# Altium footprint library LDCN Components.PcbLib: 426 footprints (part 3 of 27)
Each footprint in its own frame and in the unit in brackets; x right, y up, seen from the top. Pads: shape width x height; smd on the part's side, far side on the other; paste and mask are expansions set on the pad; w line width, h text height; cw(c..) or ccw(c..) is an arc to the next point about the centre after c.
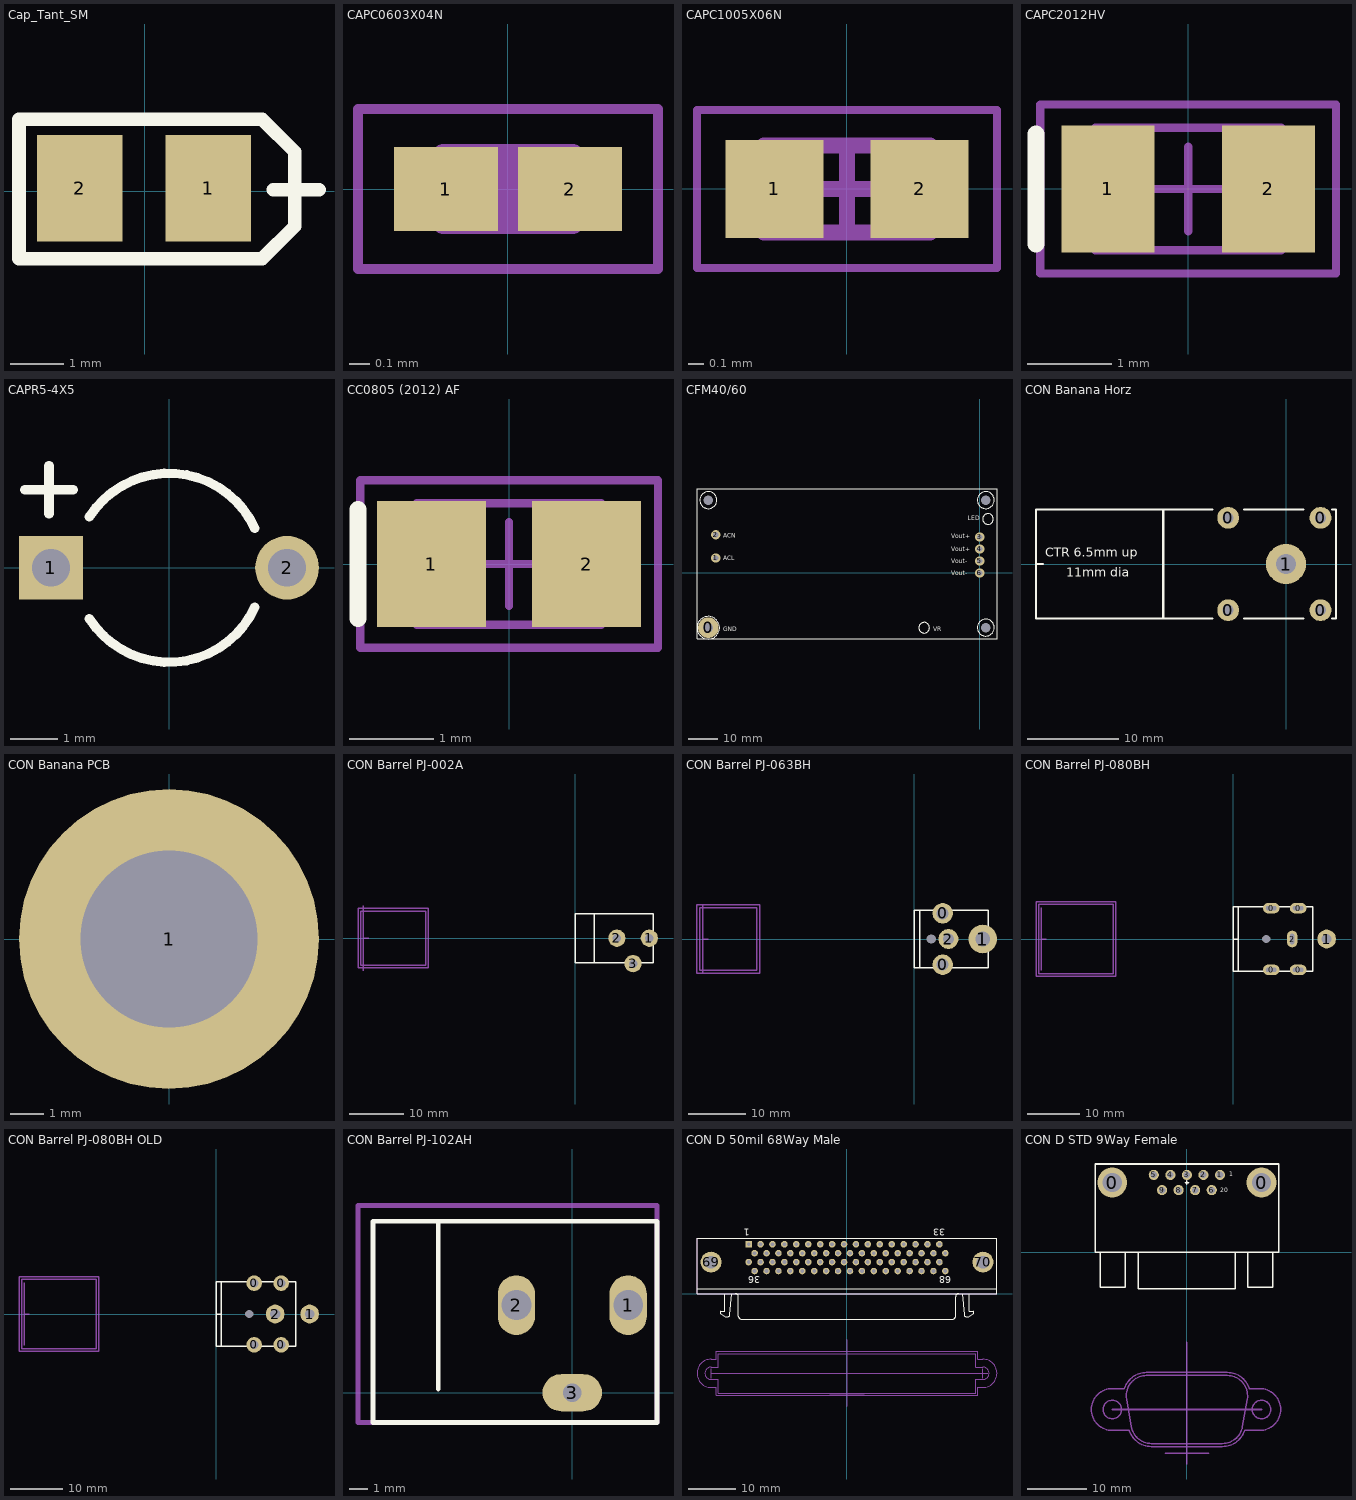
[diagram p2: the footprints below, top view; thin cyan lines are the x and y axes]

## Cap_Tant_SM [mm] "Tantalum Capacitor SM TAJA"
pads (2):
  rect 1.6x2 smd: 1(1.194,0.051) 2(-1.219,0.051)
Top Overlay:
  lines w0.254: 2.413,0.025 3.277,0.025 ; -2.362,-1.27 -2.362,1.346 2.21,1.346 2.819,0.737 2.819,-0.66 2.21,-1.27 -2.362,-1.27

## CAPC0603X04N [mm] "Chip Capacitor, 2-Leads, Body 0.60x0.30mm, IPC Medium Density"
height 0.35
pads (2):
  rect 0.52x0.42 smd: 1(-0.31,0) 2(0.31,0)
Mechanical 13:
  lines w0.1: -0.325,-0.175 -0.325,0.175 0.325,0.175 0.325,-0.175 -0.325,-0.175
Mechanical 15:
  lines w0.05: -0.75,-0.4 -0.75,0.4 0.75,0.4 0.75,-0.4 -0.75,-0.4
  lines w0.1: -0.175,0 0.175,0 ; 0,-0.175 0,0.175
3D body: height 0.35, standoff 0, extent -0.175,-0.175 0.175,0.175
3D body: height 0.35, standoff 0, extent -0.325,-0.175 -0.175,0.175
3D body: height 0.35, standoff 0, extent 0.175,-0.175 0.325,0.175

## CAPC1005X06N [mm] "Chip Capacitor, 2-Leads, Body 1.00x0.50mm, IPC Medium Density"
height 0.55
pads (2):
  rect 0.62x0.62 smd: 1(-0.46,0) 2(0.46,0)
Mechanical 13:
  lines w0.1: -0.525,-0.275 -0.525,0.275 0.525,0.275 0.525,-0.275 -0.525,-0.275
Mechanical 15:
  lines w0.05: -0.95,-0.5 -0.95,0.5 0.95,0.5 0.95,-0.5 -0.95,-0.5
  lines w0.1: -0.275,0 0.275,0 ; 0,-0.275 0,0.275
3D body "CAPC1005X06N.step": height 0.55, standoff 0, extent -0.525,-0.275 0.525,0.275

## CAPC2012HV [mm] "CAPC2012N With 30mil space between pads"
height 2
pads (2):
  rect 1.1x1.5 smd: 1(-0.95,0) 2(0.95,0)
Top Overlay:
  lines w0.2: -1.8,-0.65 -1.8,0.65
Mechanical 13:
  lines w0.1: -1.1,-0.725 1.1,-0.725 1.1,0.725 -1.1,0.725 -1.1,-0.725
Mechanical 15:
  lines w0.1: -0.5,0 0.5,0 ; 0,-0.5 0,0.5 ; -1.75,-1 1.75,-1 1.75,1 -1.75,1 -1.75,-1
3D body: height 1.1, standoff 0, extent -1.1,-0.725 1.1,0.725

## CAPR5-4X5 [mm] "Capacitor; 2 Leads"
height 12
pads (2):
  rect 1.35x1.35 hole 0.8: 1(-2.5,0)
  round 1.35 hole 0.8: 2(2.5,0)
Top Overlay:
  lines w0.2: -1.687,-1.075 ccw(c0,0) 1.819,-0.832 ; -1.687,1.075 cw(c0,0) 1.819,0.832
  lines w0.203: -3.048,1.651 -2.032,1.651 ; -2.54,1.143 -2.54,2.159

## CC0805 (2012) AF [mm] "IPC7352 with extra 0.15mm pad spacing"
pads (2):
  rect 1.3x1.5 smd: 1(-0.925,0) 2(0.925,0)
Top Overlay:
  lines w0.2: -1.8,-0.65 -1.8,0.65
Mechanical 13:
  lines w0.1: -1.1,-0.725 -1.1,0.725 1.1,0.725 1.1,-0.725 -1.1,-0.725
Mechanical 15:
  lines w0.1: -0.5,0 0.5,0 ; 0,-0.5 0,0.5 ; -1.775,-1 -1.775,1 1.775,1 1.775,-1 -1.775,-1
3D body: height 1.1, standoff 0, extent -1.1,-0.725 1.1,0.725

## CFM40/60 [mm] "Cintec CFM40/60-P PCB Mount Power Supply"
height 32.21
pads (10):
  round 7 hole 3.2: 0(-91.948,-18.542)
  round 3.2 hole 1.8: 1(-89.408,5.08) 2(-89.408,12.954) 3(0,12.192) 4(0,8.128) 5(0,4.064) 6(0,0)
  round 3 hole 3.2 unplated: ""(-91.948,24.638) ""(2.032,-18.542) ""(2.032,24.638)
Top Overlay:
  circle w0.254: c-91.948,-18.542 r3.819
  circle w0.254: c2.032,-18.506 r2.857
  circle w0.254: c2.032,24.674 r2.857
  circle w0.254: c-91.948,24.674 r2.857
  circle w0.254: c2.776,18.288 r1.796
  circle w0.254: c-18.814,-18.542 r1.796
  lines w0.254: -95.758,-22.352 5.842,-22.352 5.842,28.448 -95.758,28.448 -95.758,-22.352
  text "LED" at -4.064,17.78 h1.52
  text "VR" at -15.748,-19.812 h1.52
  text "GND" at -86.868,-19.812 h1.52
  text "ACL" at -86.868,4.318 h1.52
  text "ACN" at -86.868,11.938 h1.52
  text "Vout+" at -9.652,11.684 h1.52
  text "Vout+" at -9.652,7.366 h1.52
  text "Vout-" at -9.652,3.302 h1.52
  text "Vout-" at -9.652,-0.762 h1.52

## CON Banana Horz [mm] "Cliff FCR7350 Series"
height 8
pads (5):
  round 2.4 hole 1.2: 0(-6.36,-5.08) 0(-6.36,5.08) 0(3.8,-5.08) 0(3.8,5.08)
  round 4.4 hole 2.2: 1(0,0)
Top Overlay:
  lines w0.254: -27.5,0 -26.754,0 ; -8.1,-6 -13.5,-6 ; -8.1,6 -13.5,6 ; -4.6,-6 1.9,-6 ; -4.6,6 1.9,6 ; 5.1,-6 5.5,-6 5.5,6 5.1,6 ; -13.5,-6 -27.5,-6 -27.5,6 -13.5,6 ; -13.5,-6 -13.5,6
  text "11mm dia" at -24.2,-1.4 h1.02
  text "CTR 6.5mm up" at -26.5,0.8 h1.02

## CON Banana PCB [mm] "5.3mm Hole, 9mm Pad"
height 5
pads (1):
  round 9 hole 5.3: 1(0,0)

## CON Barrel PJ-002A [mm] "Barrel Plug (2.1mm ID, 5.5mm OD)"
height 13.16
pads (3):
  round 3.2 hole 1.6: 1(13.7,0) 2(7.7,0) 3(10.7,-4.7)
Top Overlay:
  lines w0.254: 3.5,-4.5 3.5,4.5 ; 0,-4.5 14.4,-4.5 14.4,4.5 0,4.5 0,-4.5
Mechanical 21:
  lines w0.254: -39.6,-5 -27.6,-5 -27.6,5 -39.6,5 -39.6,-5
Mechanical 22:
  lines w0.254: -39.1,-6 -39.1,6 ; -39.1,0 -38.1,0
Mechanical 25:
  lines w0.254: -40.1,-5.5 -27.1,-5.5 -27.1,5.5 -40.1,5.5 -40.1,-5.5

## CON Barrel PJ-063BH [mm] "For 5.5mm Barral Plug (2.5mm ID)"
height 9
pads (5):
  round 1 hole 1.6 unplated: 0(3,0)
  round 3.6 hole 2.1: 0(5,-4.5) 0(5,4.5)
  round 5 hole 2.6: 1(12,0)
  round 3.5 hole 1.9: 2(6,0)
Top Overlay:
  lines w0.254: 1,-5 1,5 ; 0,-5 13,-5 13,5 0,5 0,-5
Mechanical 21:
  lines w0.254: -37.5,-5.5 -37.5,5.5 -27.5,5.5 -27.5,-5.5 -37.5,-5.5
Mechanical 22:
  lines w0.254: -37,-6 -37,6 ; -37,0 -36,0
Mechanical 25:
  lines w0.254: -38,-6 -38,6 -27,6 -27,-6 -38,-6

## CON Barrel PJ-080BH [mm] "For 5.5mm Barral Plug (2.5mm ID)"
height 13.4
pads (7):
  oval 3.2x2 hole 0.8 slot 2 at 0 deg: 0(7.35,-5.95) 0(7.35,5.95) 0(12.55,-5.95) 0(12.55,5.95)
  round 3.6 hole 1.9: 1(18.05,0)
  oval 2x3.2 hole 0.8 slot 2 at 90 deg: 2(11.4,0)
  round 1 hole 1.6 unplated: 3(6.4,0)
Top Overlay:
  lines w0.254: 0,0 1,0 ; 1,-6.2 1,6.2 ; 0,-6.2 0,6.2 15.4,6.2 15.4,-6.2 0,-6.2
Mechanical 21:
  lines w0.254: -37.5,-6.7 -23.1,-6.7 -23.1,6.7 -37.5,6.7 -37.5,-6.7
Mechanical 22:
  lines w0.254: -37,-6 -37,6 ; -37,0 -36,0
Mechanical 25:
  lines w0.254: -38,-7.2 -22.6,-7.2 -22.6,7.2 -38,7.2 -38,-7.2

## CON Barrel PJ-080BH OLD [mm] "For 5.5mm Barral Plug (2.5mm ID)"
height 13.4
pads (7):
  round 3 hole 1.6: 0(7.35,-5.95) 0(7.35,5.95) 0(12.55,-5.95) 0(12.55,5.95)
  round 3.6 hole 1.8: 1(18.05,0)
  round 3.6 hole 2: 2(11.4,0)
  round 1 hole 1.6 unplated: 3(6.4,0)
Top Overlay:
  lines w0.254: 0,0 1,0 ; 1,-6.2 1,6.2 ; 0,-6.2 15.4,-6.2 15.4,6.2 0,6.2 0,-6.2
Mechanical 21:
  lines w0.254: -37.5,-6.7 -37.5,6.7 -23.1,6.7 -23.1,-6.7 -37.5,-6.7
Mechanical 22:
  lines w0.254: -37,-6 -37,6 ; -37,0 -36,0
Mechanical 25:
  lines w0.254: -38,-7.2 -38,7.2 -22.6,7.2 -22.6,-7.2 -38,-7.2

## CON Barrel PJ-102AH [mm] "5.5mm Barrel Plug (2.1mm ID)"
height 13.16
pads (3):
  oval 2x3.2 hole 1.6 square: 1(3,4.7) 2(-3,4.7)
  oval 3.2x2 hole 1 square: 3(0,0)
Top Overlay:
  lines w0.254: -7.2,0.2 -7.2,9.2 ; -10.7,-1.6 -10.7,9.2 4.55,9.2 4.55,6.1 4.55,3.3 4.55,-1.6 -10.7,-1.6
Mechanical 21:
  lines w0.254: -11.5,-1.6 -11.5,10.05 4.55,10.05 4.55,-1.6 -11.5,-1.6
3D body "CUI_DEVICES_PJ-102AH.step": height 11.01, standoff -3.49, extent -10.65,-0.25 3.75,9.15

## CON D 50mil 68Way Male [mm] "TE 777600-01 (Labview 68 Pin Connector)"
pads (70):
  rect 1.4x1.4 hole 0.8: 1(-20.955,10.499)
  round 1.4 hole 0.8: 2(-19.685,8.594) 3(-18.415,10.499) 4(-17.145,8.594) 5(-15.875,10.499) 6(-14.605,8.594) 7(-13.335,10.499) 8(-12.065,8.594) 9(-10.795,10.499) 10(-9.525,8.594) 11(-8.255,10.499) 12(-6.985,8.594) 13(-5.715,10.499) 14(-4.445,8.594) 15(-3.175,10.499) 16(-1.905,8.594) 17(-0.635,10.499) 18(0.635,8.594) 19(1.905,10.499) 20(3.175,8.594) 21(4.445,10.499) 22(5.715,8.594) 23(6.985,10.499) 24(8.255,8.594) 25(9.525,10.499) 26(10.795,8.594) 27(12.065,10.499) 28(13.335,8.594) 29(14.605,10.499) 30(15.875,8.594) 31(17.145,10.499) 32(18.415,8.594) 33(19.685,10.499) 34(20.955,8.594) 35(-20.955,6.689) 36(-19.685,4.784) 37(-18.415,6.689) 38(-17.145,4.784) 39(-15.875,6.689) 40(-14.605,4.784) 41(-13.335,6.689) 42(-12.065,4.784) 43(-10.795,6.689) 44(-9.525,4.784) 45(-8.255,6.689) 46(-6.985,4.784) 47(-5.715,6.689) 48(-4.445,4.784) 49(-3.175,6.689) 50(-1.905,4.784) 51(-0.635,6.689) 52(0.635,4.784) 53(1.905,6.689) 54(3.175,4.784) 55(4.445,6.689) 56(5.715,4.784) 57(6.985,6.689) 58(8.255,4.784) 59(9.525,6.689) 60(10.795,4.784) 61(12.065,6.689) 62(13.335,4.784) 63(14.605,6.689) 64(15.875,4.784) 65(17.145,6.689) 66(18.415,4.784) 67(19.685,6.689) 68(20.955,4.784)
  round 4.45 hole 2.7: 69(-28.955,6.689) 70(28.955,6.689)
Top Overlay:
  lines w0.2: -31.95,0.984 31.95,0.984 ; -26.915,-4.271 -25.975,-4.898 -25.253,-4.898 ccw(c-25.355,-4.501) -24.945,-4.501 ; -26.901,-4.255 cw(c-26.675,-4.011) -26.925,-3.79 -26.045,-3.79 -26.045,-0.001 ; -24.945,-4.52 -24.575,-0.001 ; -23.835,-0.006 cw(c-23.835,-0.701) -23.14,-0.701 -23.14,-4.806 ccw(c-22.445,-4.806) -22.445,-5.501 22.445,-5.501 ccw(c22.445,-4.806) 23.14,-4.806 23.14,-0.7 cw(c23.835,-0.701) 23.835,-0.006 ; 24.575,-0.001 24.945,-4.52 ; 24.945,-4.501 ccw(c25.355,-4.501) 25.253,-4.898 25.975,-4.898 26.915,-4.271 ; 26.045,-0.001 26.045,-3.79 26.925,-3.79 cw(c26.675,-4.011) 26.901,-4.255 ; -31.95,-0.001 -31.95,11.8 31.95,11.8 31.95,-0.001 -31.95,-0.001
  text "1" at -20.705,13.774 h1.5
  text "33" at 20.935,13.774 h1.5
  text "68" at 22.205,3.709 h1.5
  text "36" at -18.435,3.709 h1.5
Mechanical 13:
  lines w0.1: -31.95,-0.001 31.95,-0.001 31.95,11.799 -31.95,11.799 -31.95,-0.001
Mechanical 21:
  lines w0.254: -28.955,-18.301 cw(c-28.955,-17.001) -28.955,-15.701 -27.4,-15.701 -27.4,-12.801 27.4,-12.801 27.4,-15.701 28.955,-15.701 cw(c28.955,-17.001) 28.955,-18.301 27.4,-18.301 27.4,-21.201 -27.4,-21.201 -27.4,-18.301 -28.955,-18.301
Mechanical 22:
  lines w0.254: -28.955,-18.001 -28.955,-16.001 ; -28.955,-17.001 30,-17.001 ; -3.65,-21.351 3.65,-21.351 ; 0,-24.001 0,-9.8 0,-21.351 ; 28.955,-18.001 28.955,-16.001
Mechanical 25:
  lines w0.254: 27.9,-21.701 -27.9,-21.701 -27.9,-20 -28.955,-20 cw(c-28.955,-17.001) -28.955,-14.001 -27.9,-14.001 -27.9,-12.301 27.9,-12.301 ; 27.9,-21.701 27.9,-20 28.955,-20 ccw(c28.955,-17.001) 28.955,-14.001 27.9,-14.001 27.9,-12.301

## CON D STD 9Way Female [mm] "9 Way Female D Sub RA PCB"
pads (11):
  round 5 hole 3.2: 0(-12.495,11.7) 0(12.495,11.7)
  round 1.7 hole 1.1: 1(5.54,12.97) 2(2.77,12.97) 3(0,12.97) 4(-2.77,12.97) 5(-5.54,12.97) 6(4.155,10.43) 7(1.385,10.43) 8(-1.385,10.43) 9(-4.155,10.43)
Top Overlay:
  lines w0.254: -14.51,0 -14.51,-5.8 -10.31,-5.8 -10.31,0 ; -8.11,0 -8.11,-6.1 8.11,-6.1 8.11,0 ; -0.3,11.7 0.3,11.7 ; 0,11.4 0,12 ; 10.21,0 10.21,-5.8 14.41,-5.8 14.41,0 ; -15.36,0 -15.36,14.8 15.36,14.8 15.36,0 -15.36,0
  text "1" at 7.095,12.73 h0.76
  text "20" at 5.595,10.03 h0.76
Mechanical 2:
  lines w0.013: 0,-35.3 0,-19.3
Mechanical 21:
  circle w0.254: c-12.495,-26.3 r1.55
  circle w0.254: c12.495,-26.3 r1.55
  lines w0.254: 5.949,-32 ccw(c5.949,-28.6) 9.297,-29.19 ; 5.949,-32 ccw(c5.949,-28.6) 9.297,-29.19 ; 5.949,-32 -5.949,-32 cw(c-5.949,-28.6) -9.297,-29.19 -10.108,-24.59 cw(c-6.76,-24) -6.76,-20.6 6.76,-20.6 ; 6.76,-20.6 cw(c6.76,-24) 10.108,-24.59 ; 6.76,-20.6 cw(c6.76,-24) 10.108,-24.59 ; 9.297,-29.19 10.108,-24.59
Mechanical 22:
  lines w0.254: -12.495,-26.3 12.495,-26.3 ; -3.65,-33.6 3.65,-33.6 ; 0,-35.425 0,-15.05 ; 0,-33.6 0,-26.3
Mechanical 25:
  lines w0.254: -10.471,-22.8 cw(c-6.76,-24) -6.76,-20.1 6.76,-20.1 cw(c6.76,-24) 10.471,-22.8 ; -10.471,-22.799 -12.495,-22.8 ccw(c-12.495,-26.3) -12.495,-29.8 -9.66,-29.799 ; -9.66,-29.798 ccw(c-5.949,-28.6) -5.949,-32.5 5.949,-32.5 ccw(c5.949,-28.6) 9.66,-29.798 ; 9.66,-29.799 12.195,-29.8 ccw(c12.195,-26.3) 12.195,-22.8 10.471,-22.799